# Altium footprint library 开关.PcbLib: 21 footprints (part 2 of 2)
Each footprint in its own frame and in the unit in brackets; x right, y up, seen from the top. Pads: shape width x height; smd on the part's side, far side on the other; paste and mask are expansions set on the pad; w line width, h text height; cw(c..) or ccw(c..) is an arc to the next point about the centre after c.
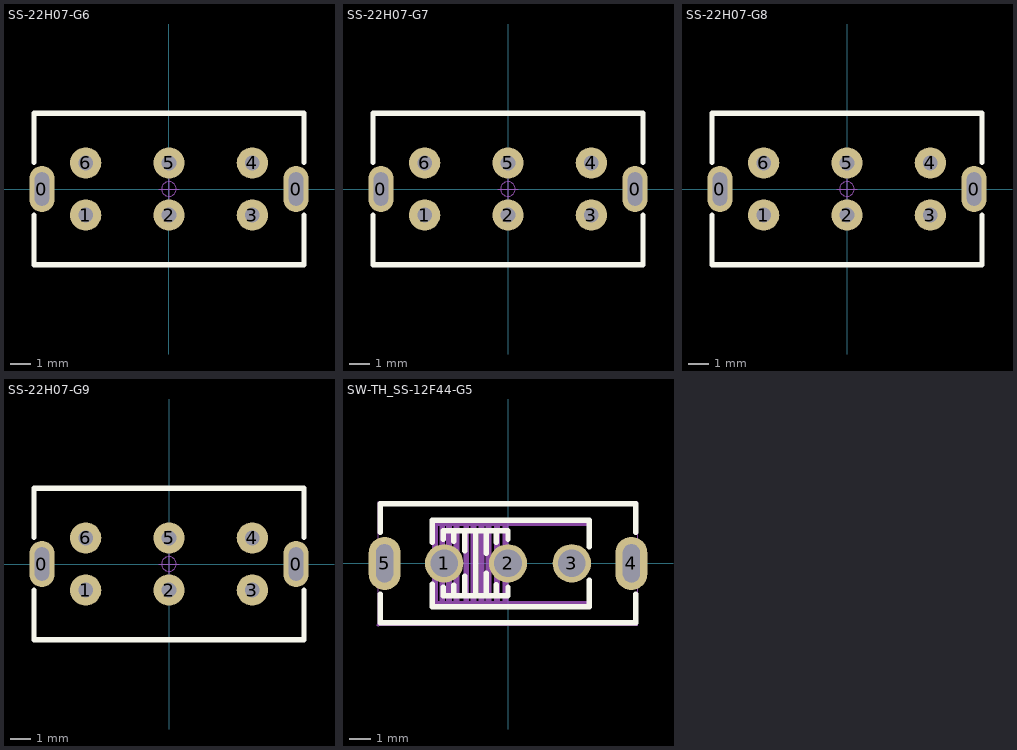
[diagram p1: the footprints below, top view; thin cyan lines are the x and y axes]

## SS-22H07-G6 [mm] "柄长6mm，12.7x7x4.7mm(长宽高)，脚距：4mm"
pads (8):
  oval 1.2x2.2 hole 0.7 slot 1.6 at 90 deg: 0(-6.1,0) 0(6.1,0)
  round 1.5 hole 0.7: 1(-4,-1.25) 2(0,-1.25) 3(4,-1.25) 4(4,1.25) 5(0,1.25) 6(-4,1.25)
Top Overlay:
  lines w0.25: -6.477,-1.25 -6.477,-3.632 6.477,-3.632 6.477,-1.25 ; -6.477,1.27 -6.477,3.632 6.477,3.632 6.477,1.27
Mechanical 15:
  circle w0.05: c0,0 r0.35
  lines w0.05: -0.5,0 0.5,0 ; 0,-0.5 0,0.5
3D body "SS-22H07-G6.STEP": height 10.7, standoff -3.3, extent -6.351,-3.501 6.351,3.501

## SS-22H07-G7 [mm] "柄长7mm，12.7x7x4.7mm(长宽高)，脚距：4mm"
pads (8):
  oval 1.2x2.2 hole 0.7 slot 1.6 at 90 deg: 0(-6.1,0) 0(6.1,0)
  round 1.5 hole 0.7: 1(-4,-1.25) 2(0,-1.25) 3(4,-1.25) 4(4,1.25) 5(0,1.25) 6(-4,1.25)
Top Overlay:
  lines w0.25: -6.477,-1.25 -6.477,-3.632 6.477,-3.632 6.477,-1.25 ; -6.477,1.27 -6.477,3.632 6.477,3.632 6.477,1.27
Mechanical 15:
  circle w0.05: c0,0 r0.35
  lines w0.05: -0.5,0 0.5,0 ; 0,-0.5 0,0.5
3D body "SS-22H07-G7.STEP": height 11.7, standoff -3.3, extent -6.351,-3.501 6.351,3.501

## SS-22H07-G8 [mm] "柄长8mm，12.7x7x4.7mm(长宽高)，脚距：4mm"
pads (8):
  oval 1.2x2.2 hole 0.7 slot 1.6 at 90 deg: 0(-6.1,0) 0(6.1,0)
  round 1.5 hole 0.7: 1(-4,-1.25) 2(0,-1.25) 3(4,-1.25) 4(4,1.25) 5(0,1.25) 6(-4,1.25)
Top Overlay:
  lines w0.25: -6.477,-1.25 -6.477,-3.632 6.477,-3.632 6.477,-1.25 ; -6.477,1.27 -6.477,3.632 6.477,3.632 6.477,1.27
Mechanical 15:
  circle w0.05: c0,0 r0.35
  lines w0.05: -0.5,0 0.5,0 ; 0,-0.5 0,0.5
3D body "SS-22H07-G8.STEP": height 12.7, standoff -3.3, extent -6.351,-3.501 6.351,3.501

## SS-22H07-G9 [mm] "柄长9mm，12.7x7x4.7mm(长宽高)，脚距：4mm"
pads (8):
  oval 1.2x2.2 hole 0.7 slot 1.6 at 90 deg: 0(-6.1,0) 0(6.1,0)
  round 1.5 hole 0.7: 1(-4,-1.25) 2(0,-1.25) 3(4,-1.25) 4(4,1.25) 5(0,1.25) 6(-4,1.25)
Top Overlay:
  lines w0.25: -6.477,-1.25 -6.477,-3.632 6.477,-3.632 6.477,-1.25 ; -6.477,1.27 -6.477,3.632 6.477,3.632 6.477,1.27
Mechanical 15:
  circle w0.05: c0,0 r0.35
  lines w0.05: -0.5,0 0.5,0 ; 0,-0.5 0,0.5
3D body "SS-22H07-G9.STEP": height 13.7, standoff -3.3, extent -6.351,-3.501 6.351,3.501

## SW-TH_SS-12F44-G5 [mm]
pads (5):
  round 1.8 hole 1.3: 1(-3,0) 2(0,0) 3(3,0)
  oval 1.5x2.5 hole 0.8 slot 1.8 at 90 deg: 4(5.8,0) 5(-5.8,0)
Top Overlay:
  lines w0.254: -6,-1.46 -6,-2.8 6,-2.8 6,-1.46 ; -6,1.46 -6,2.8 6,2.8 6,1.46 ; -3.556,-0.985 -3.556,-2.032 3.81,-2.032 3.81,-0.788 ; -3.556,0.985 -3.556,2.032 3.81,2.032 3.81,0.788 ; -3.048,-1.13 -3.048,-1.524 0,-1.524 0,-1.131 ; -3.048,1.13 -3.048,1.524 0,1.524 0,1.131 ; -2.549,-1.524 -2.549,-1.037 ; -2.549,1.037 -2.549,1.524 ; -2.041,-1.524 -2.041,-0.598 ; -2.041,0.598 -2.041,1.524 ; -1.524,-1.524 -1.524,1.524 ; -1.025,-1.524 -1.025,-0.474 ; -1.025,0.474 -1.025,1.524 ; -0.543,-1.524 -0.543,-0.992 ; -0.543,0.992 -0.543,1.524
Mechanical 6:
  region: -2.963,1.778 -3.217,1.778 -3.217,-1.778 -2.963,-1.778
  region: -2.648,1.778 -2.902,1.778 -2.902,-1.778 -2.648,-1.778
  region: -2.286,1.778 -2.54,1.778 -2.54,-1.778 -2.286,-1.778
  region: -1.834,1.778 -2.088,1.778 -2.088,-1.778 -1.834,-1.778
  region: -1.486,1.778 -1.74,1.778 -1.74,-1.778 -1.486,-1.778
  region: -1.124,1.778 -1.378,1.778 -1.378,-1.778 -1.124,-1.778
  region: -0.781,1.787 -1.035,1.787 -1.035,-1.769 -0.781,-1.769
  region: -0.395,1.787 -0.649,1.787 -0.649,-1.769 -0.395,-1.769
  region: 0,1.778 -0.254,1.778 -0.254,-1.778 0,-1.778
  region: -3.302,-1.778 3.81,-1.778 3.81,-2.032 -3.302,-2.032
  region: -3.556,2.032 -3.556,-2.032 -3.302,-2.032 -3.302,1.778
  region: -3.556,2.032 3.81,2.032 3.81,1.778 -3.556,1.778
Mechanical 15:
  region: 2.6,0.23 3.4,0.23 3.4,-0.23 2.6,-0.23
  region: -0.4,0.23 0.4,0.23 0.4,-0.23 -0.4,-0.23
  region: -3.4,0.23 -2.6,0.23 -2.6,-0.23 -3.4,-0.23
  region: 6.025,0.6 6.025,-0.6 5.575,-0.6 5.575,0.6
  region: -5.575,0.6 -5.575,-0.6 -6.025,-0.6 -6.025,0.6
  region: -6.04,-2.9 -6.04,-2.875 -6.075,-2.84 -6.125,-2.84 -6.16,-2.875 -6.16,-2.9 -6.16,-2.925 -6.125,-2.96 -6.075,-2.96 -6.04,-2.925 -6.04,-2.9
  lines w0.051: -6.1,-2.9 -6.1,2.9 6.1,2.9 6.1,-2.9 -6.1,-2.9